# Altium integrated library ICL_komponenty_v1.IntLib: 293 symbols (part 1 of 2) (continued)
## DTSV_SMAJ15A_A001
designator D?, comment SMAJ15A
Single Line TVS Diode  15V 43A; ICLN: DTSV_SMAJ15A_15V_DO214AC_A001
footprint DO214AC
pins: 1 A, 2 K

## DTSV_SMBJ130A_A001
designator D?, comment SMBJ130A
Single Line TVS Diode  130V 600W; ICLN: DTSV_SMBJ130A_130V_DO214AA_A001
footprint DO214AA
pins: 1 A, 2 K

## DTSV_SMCJ60CA_60V_A001
designator D?, comment SMCJ60CA
60V  TVS Diode; ICLN: DTSV_SMCJ60CA_DO214AB_A001
footprint DO-214AB (DO-214AB TSV)
pins: 1 A, 2 K

## DTSV_VCAN16A2-03S_STO23_A001
designator D?, comment VCAN16A2-03S
dual Line TVS Diode  17V; ICLN: DTSV_VCAN16A2-03S_STO23_A001
footprint SOT-23
pins: 1, 2, 3

## DTSVA_2xUni_5V_A001
designator D?, comment RClamp0502
5V Dual Line TVS Diode; ICLN: D_TSVA_2xUNI_5V_SOT323_N001
footprint SOT-523
pins: 1 K, 2 K, 3 CA

## DTSVA_ESDA5V3SC5_A001
designator D?, comment ESDA5V3C5
Quad TSV array 5V3; ITSN: DTSVA_ESDA5V3SC5_5V9_22A_SOT23-6_A001
footprint SOT23-6 (Zetex)
pins: 1, 2, 3, 4, 5, 6

## DTSVA_USBLC6-2_A001
designator D?, comment ESDA5V3C5
Quad TSV array 5V3; ITSN: DTSVA_USBLC6_SOT-26_A001
footprint SOT23-6 (Zetex)
pins: 1, 2, 3, 4, 5, 6

## DW02
designator U?, comment DW02C
Lithium battery protected circuit; ICLN: IC_DW02C_SOT23-6_A001
footprint SOT-23-5
pins: 1 NC, 2 GND, 3 VDD (power), 4 VM (power), 5 VM (power)

## DZ_4V3_MMSZ4687_A001
designator D?, comment 4V3
4V3 Zener Iz=50uA SOD-123; ICLN: DZ_4V3_50uA_SOD123_A001
footprint SOD-123
pins: 1 A, 2 K

## DZ_5V6_SOD323_A001
designator D?, comment 5V6
5V6 2%; ICLN: DZ_5V6_SOD323_A001
footprint SOD-323
pins: 1 A, 2 K

## DZ_6V2_ZMM6V2_A001
designator D?, comment ZMM6V2
6V2 Zener, LL-34 MiniMelf; ICLN: nn
footprint MINIMELF
pins: 1 A, 2 K

## DZ_8V2_BZX585_A001
designator D?, comment BZX585-C8V2
8V2 Zener, SOD-523; ITSN: DZ_8V2_BZX585_SOD-523_A001
footprint SOD-523 (SC-79)
pins: 1 A, 2 K

## DZ_8V2_MMSZ5237_A001
designator D?, comment MMSZ5237
8V2 Zener, SOD-323; ITSN: DZ_8V2_MMSZ5237_SOD323_A001
footprint SOD-323
pins: 1 A, 2 K

## DZ_12V_BZX384-B12_A001
designator D?, comment BZX384-B12
12V Zener Iz=50uA SOD-323; ITSN: DZ_12V_BZX384_SOD323_A001
footprint SOD-323
pins: 1 A, 2 K

## DZ_12V_DMP4051LK3_A001
designator D?, comment DMP4051LK3
12V Zener Iz=250uA SOD-123; ICLN: DZ_12V_MMSZ5242B_SOD-123_A001
footprint SOD-123
pins: 1 A, 2 K

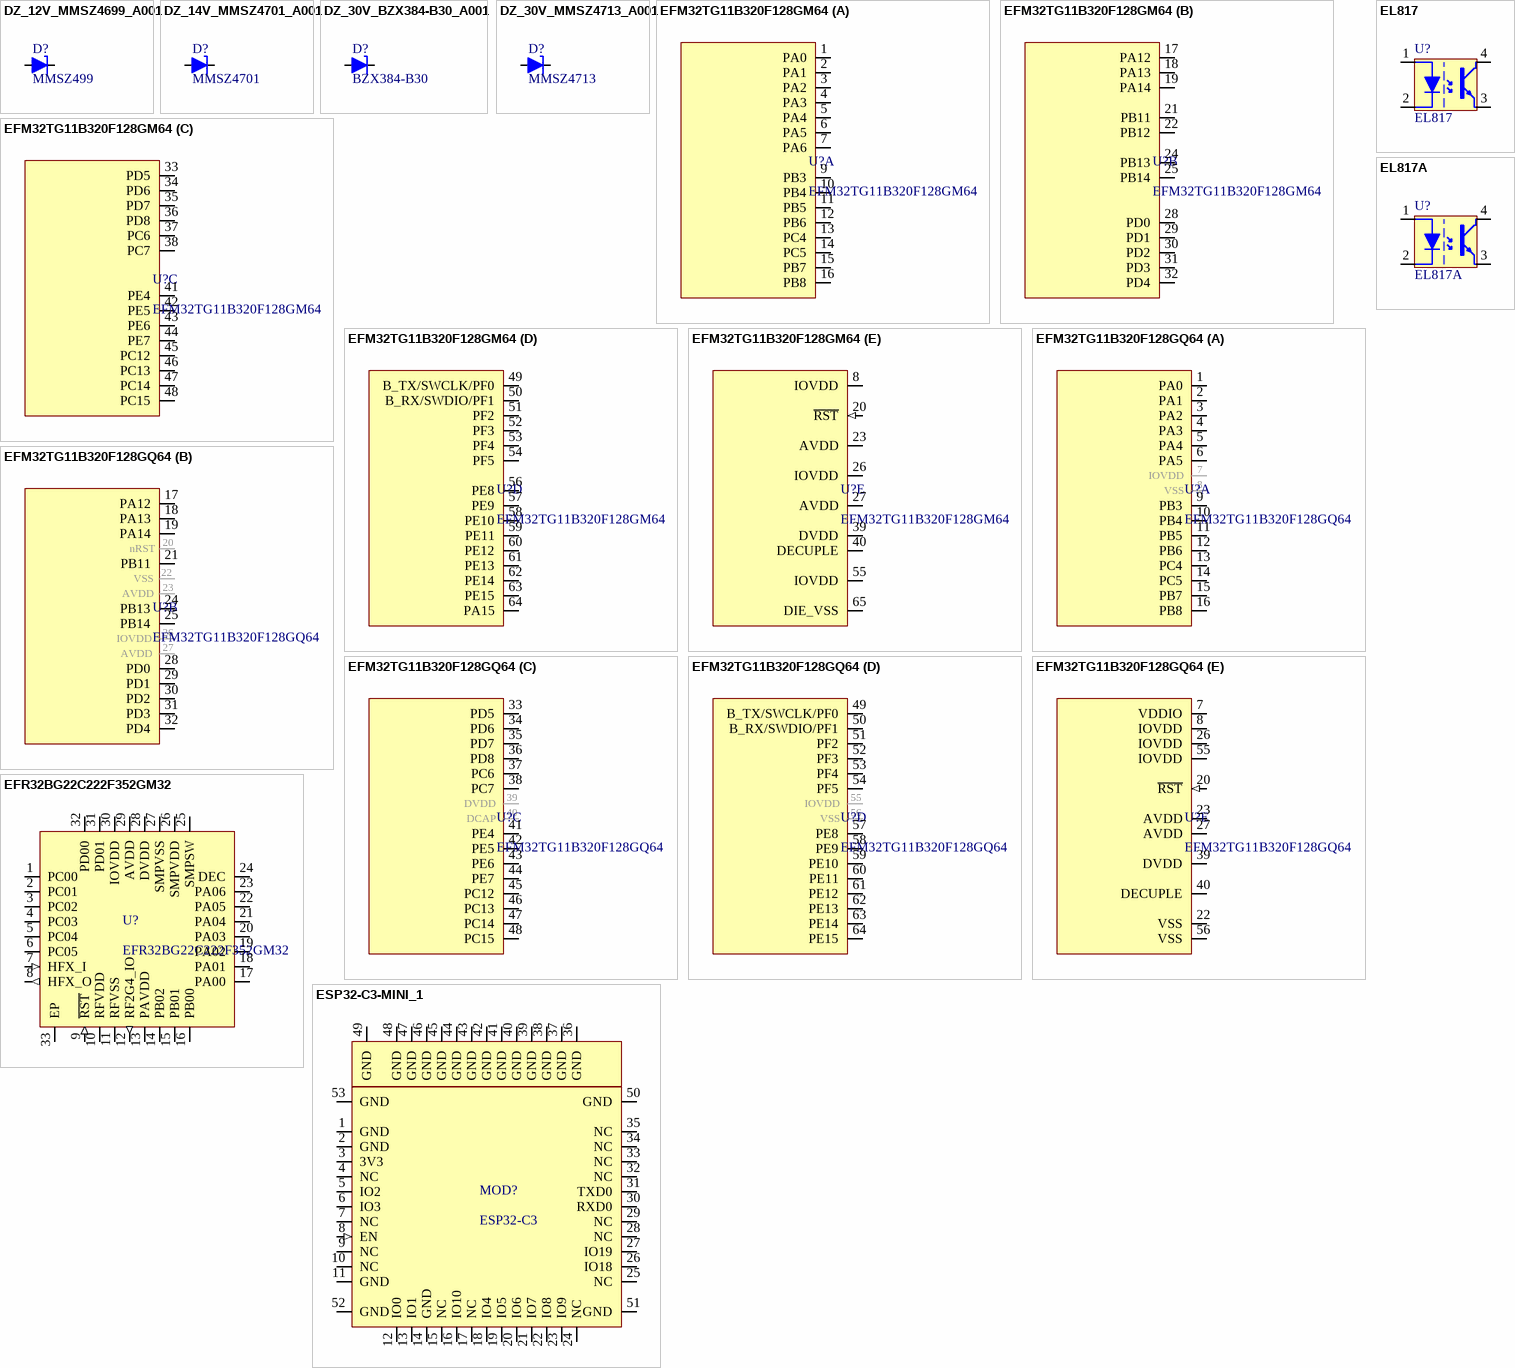
[diagram p4: symbols DZ_12V_MMSZ4699_A001 to ESP32-C3-MINI_1]

## DZ_12V_MMSZ4699_A001
designator D?, comment MMSZ499
12V Zener Iz=50uA SOD-123; ITSN: DZ_12V_MMSZ4699_SOD-123_A001
footprint SOD-123
pins: 1 A, 2 K

## DZ_14V_MMSZ4701_A001
designator D?, comment MMSZ4701
14V Zener Iz=50uA SOD-123; ICLN: DZ_14V_MMSZ4701_SOD-123_A001
footprint SOD-123
pins: 1 A, 2 K

## DZ_30V_BZX384-B30_A001
designator D?, comment BZX384-B30
30V Zener Iz=50uA SOD-323; ITSN: DZ_30V_BZX384_SOD323_A001
footprint SOD-323
pins: 1 A, 2 K

## DZ_30V_MMSZ4713_A001
designator D?, comment MMSZ4713
30V Zener Iz=50uA SOD-123; ITSN: DZ_30V_MMSZ4713_SOD-123_A001
footprint SOD-123
pins: 1 A, 2 K

## EFM32TG11B320F128GM64
designator U?
EFM32TG11 FAMILY: EFM32TG11B3XX; ITSN: IC_EFM32TG11B320_QFN64_A001
footprint QFN64_A001 (GECO SILICON LABS)
part A pins: 1 PA0 (io), 2 PA1 (io), 3 PA2 (io), 4 PA3 (io), 5 PA4 (io), 6 PA5 (io), 7 PA6 (io), 9 PB3 (io), 10 PB4 (io), 11 PB5 (io), 12 PB6 (io), 13 PC4 (io), 14 PC5 (io), 15 PB7 (io), 16 PB8 (io)
part B pins: 17 PA12 (io), 18 PA13 (io), 19 PA14 (io), 21 PB11 (io), 22 PB12 (io), 24 PB13 (io), 25 PB14 (io), 28 PD0 (io), 29 PD1 (io), 30 PD2 (io), 31 PD3 (io), 32 PD4 (io)
part C pins: 33 PD5 (io), 34 PD6 (io), 35 PD7 (io), 36 PD8 (io), 37 PC6 (io), 38 PC7 (io), 41 PE4 (io), 42 PE5 (io), 43 PE6 (io), 44 PE7 (io), 45 PC12 (io), 46 PC13 (io), 47 PC14 (io), 48 PC15 (io)
part D pins: 49 B_TX/SWCLK/PF0 (io), 50 B_RX/SWDIO/PF1 (io), 51 PF2 (io), 52 PF3 (io), 53 PF4 (io), 54 PF5 (io), 56 PE8 (io), 57 PE9 (io), 58 PE10 (io), 59 PE11 (io), 60 PE12 (io), 61 PE13 (io), 62 PE14 (io), 63 PE15 (io), 64 PA15 (io)
part E pins: 8 IOVDD (power), 20 ~{RST} (in), 23 AVDD (power), 26 IOVDD (power), 27 AVDD (power), 39 DVDD (power), 40 DECUPLE, 55 IOVDD (power), 65 DIE_VSS

## EFM32TG11B320F128GQ64
designator U?
EFM32TG11 FAMILY: EFM32TG11B3XX LQFP64; ITSN: IC_EFM32TG11B320_QFP64_A001
footprint LQFP64_small (TSQFP, 64-Leads, Body 10,00x10,00mm, Pitch 0,50mm)
part A pins: 1 PA0 (io), 2 PA1 (io), 3 PA2 (io), 4 PA3 (io), 5 PA4 (io), 6 PA5 (io), 9 PB3 (io), 10 PB4 (io), 11 PB5 (io), 12 PB6 (io), 13 PC4 (io), 14 PC5 (io), 15 PB7 (io), 16 PB8 (io)
part B pins: 17 PA12 (io), 18 PA13 (io), 19 PA14 (io), 21 PB11 (io), 24 PB13 (io), 25 PB14 (io), 28 PD0 (io), 29 PD1 (io), 30 PD2 (io), 31 PD3 (io), 32 PD4 (io)
part C pins: 33 PD5 (io), 34 PD6 (io), 35 PD7 (io), 36 PD8 (io), 37 PC6 (io), 38 PC7 (io), 41 PE4 (io), 42 PE5 (io), 43 PE6 (io), 44 PE7 (io), 45 PC12 (io), 46 PC13 (io), 47 PC14 (io), 48 PC15 (io)
part D pins: 49 B_TX/SWCLK/PF0 (io), 50 B_RX/SWDIO/PF1 (io), 51 PF2 (io), 52 PF3 (io), 53 PF4 (io), 54 PF5 (io), 57 PE8 (io), 58 PE9 (io), 59 PE10 (io), 60 PE11 (io), 61 PE12 (io), 62 PE13 (io), 63 PE14 (io), 64 PE15 (io)
part E pins: 7 VDDIO (power), 8 IOVDD (power), 20 ~{RST} (in), 22 VSS (power), 23 AVDD (power), 26 IOVDD (power), 27 AVDD (power), 39 DVDD (power), 40 DECUPLE, 55 IOVDD (power), 56 VSS (power)
part B text: nRST
part C text: DCAP

## EFR32BG22C222F352GM32
designator U?
EFR32BG22 Wireless Gecko SoC 32Kram 352Kflash; ICLN: IC_EFR32BG22C222F352_QFN32_A01
footprint QFN32_EFM32 (Silicon Labs)
pins: 1 PC00 (io), 2 PC01 (io), 3 PC02 (io), 4 PC03 (io), 5 PC04 (io), 6 PC05 (io), 7 HFX_I (in), 8 HFX_O (out), 9 ~{RST} (in), 10 RFVDD (power), 11 RFVSS (power), 12 RF2G4_IO (out), 13 PAVDD (power), 14 PB02 (io), 15 PB01 (io), 16 PB00 (io), 17 PA00 (io), 18 PA01 (io), 19 PA02 (io), 20 PA03 (io), 21 PA04 (io), 22 PA05 (io), 23 PA06 (io), 24 DEC, 25 SMPSW, 26 SMPVDD, 27 SMPVSS, 28 DVDD (power), 29 AVDD (power), 30 IOVDD (power), 31 PD01 (io), 32 PD00 (io), 33 EP

## EL817
designator U?
EL817 50%; ICLN: OCT_EL817_SMD_A001
footprint Mini-Flat_4_10mm (10mm version)
pins: 1 A, 2 K, 3 E, 4 C

## EL817A
designator U?
EL817 60-160%; ICLN: OCT_EL817A_SMD_A002
footprint Mini-Flat_4_10mm (10mm version)
pins: 1 A, 2 K, 3 E, 4 C

## ESP32-C3-MINI_1
designator MOD?, comment ESP32-C3
ICLN: MOD_ESP32_C3_MINI_1_A001
footprint ESP32_C3_MINI_1
pins: 1 GND (power), 2 GND (power), 3 3V3 (power), 4 NC, 5 IO2 (io), 6 IO3 (io), 7 NC, 8 EN (in), 9 NC, 10 NC, 11 GND (power), 12 IO0 (io), 13 IO1 (io), 14 GND (power), 15 NC, 16 IO10 (io), 17 NC, 18 IO4 (io), 19 IO5 (io), 20 IO6 (io), 21 IO7 (io), 22 IO8 (io), 23 IO9 (io), 24 NC, 25 NC, 26 IO18 (io), 27 IO19 (io), 28 NC, 29 NC, 30 RXD0 (io), 31 TXD0 (io), 32 NC, 33 NC, 34 NC, 35 NC, 36 GND (power), 37 GND (power), 38 GND (power), 39 GND (power), 40 GND (power), 41 GND (power), 42 GND (power), 43 GND (power), 44 GND (power), 45 GND (power), 46 GND (power), 47 GND (power), 48 GND (power), 49 GND (power), 50 GND (power), 51 GND (power), 52 GND (power), 53 GND (power)

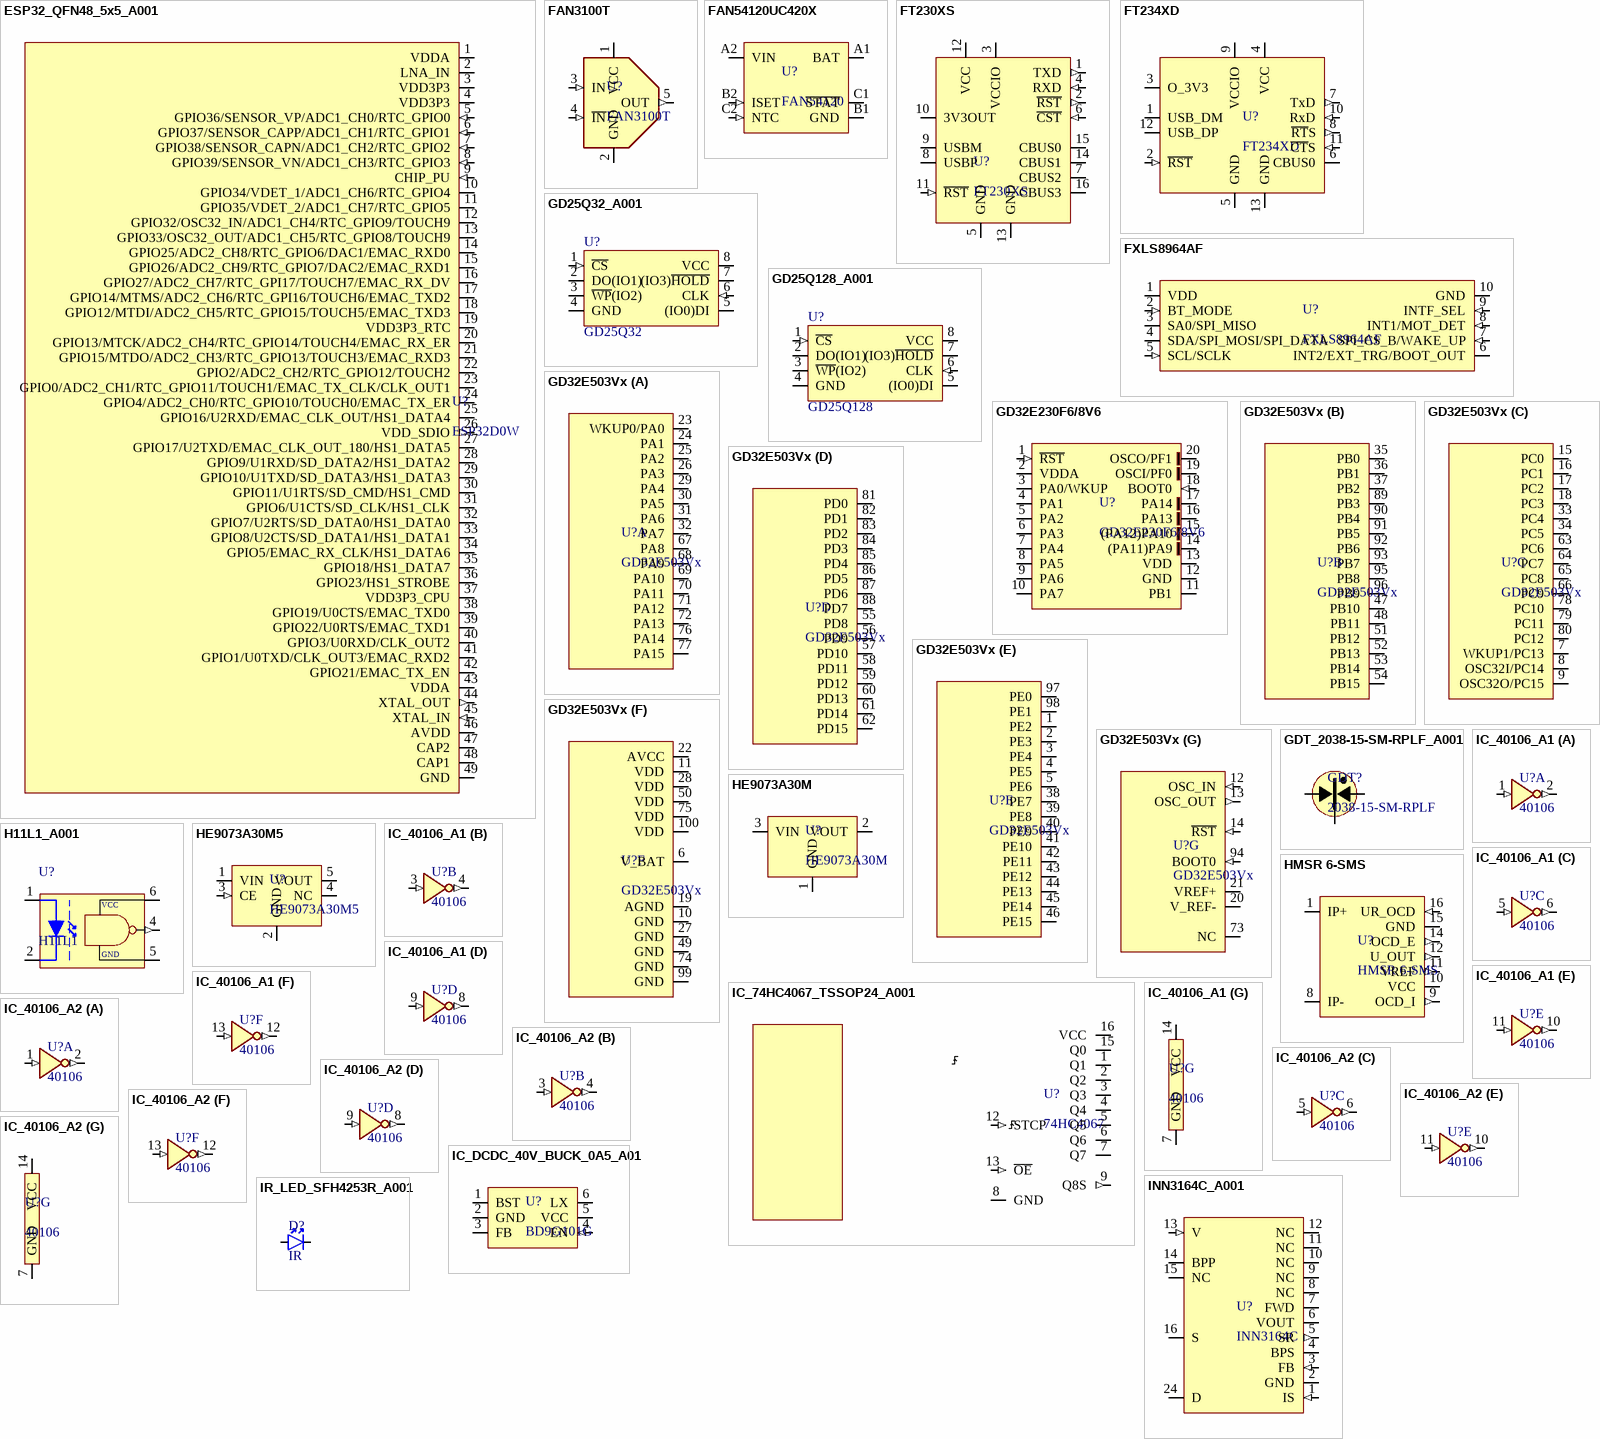
[diagram p5: symbols ESP32_QFN48_5x5_A001 to IR_LED_SFH4253R_A001]

## ESP32_QFN48_5x5_A001
designator U?, comment ESP32D0W
ESP32 QFN48 5x5; ITSN: IC_ESP32D0W_QFN48_A001
footprint QFN48_5_5_v1 (QFN48 5x5)
pins: 1 VDDA (power), 2 LNA_IN, 3 VDD3P3 (power), 4 VDD3P3 (power), 5 GPIO36/SENSOR_VP/ADC1_CH0/RTC_GPIO0 (in), 6 GPIO37/SENSOR_CAPP/ADC1_CH1/RTC_GPIO1 (in), 7 GPIO38/SENSOR_CAPN/ADC1_CH2/RTC_GPIO2 (in), 8 GPIO39/SENSOR_VN/ADC1_CH3/RTC_GPIO3 (in), 9 CHIP_PU (in), 10 GPIO34/VDET_1/ADC1_CH6/RTC_GPIO4 (io), 11 GPIO35/VDET_2/ADC1_CH7/RTC_GPIO5 (io), 12 GPIO32/OSC32_IN/ADC1_CH4/RTC_GPIO9/TOUCH9 (io), 13 GPIO33/OSC32_OUT/ADC1_CH5/RTC_GPIO8/TOUCH9 (io), 14 GPIO25/ADC2_CH8/RTC_GPIO6/DAC1/EMAC_RXD0 (io), 15 GPIO26/ADC2_CH9/RTC_GPIO7/DAC2/EMAC_RXD1 (io), 16 GPIO27/ADC2_CH7/RTC_GPI17/TOUCH7/EMAC_RX_DV (io), 17 GPIO14/MTMS/ADC2_CH6/RTC_GPI16/TOUCH6/EMAC_TXD2 (io), 18 GPIO12/MTDI/ADC2_CH5/RTC_GPIO15/TOUCH5/EMAC_TXD3 (io), 19 VDD3P3_RTC (power), 20 GPIO13/MTCK/ADC2_CH4/RTC_GPIO14/TOUCH4/EMAC_RX_ER (io), 21 GPIO15/MTDO/ADC2_CH3/RTC_GPIO13/TOUCH3/EMAC_RXD3 (io), 22 GPIO2/ADC2_CH2/RTC_GPIO12/TOUCH2 (io), 23 GPIO0/ADC2_CH1/RTC_GPIO11/TOUCH1/EMAC_TX_CLK/CLK_OUT1 (io), 24 GPIO4/ADC2_CH0/RTC_GPIO10/TOUCH0/EMAC_TX_ER (io), 25 GPIO16/U2RXD/EMAC_CLK_OUT/HS1_DATA4 (io), 26 VDD_SDIO (out) "OUTPUT 1V8 OR VDD3P3_RTC", 27 GPIO17/U2TXD/EMAC_CLK_OUT_180/HS1_DATA5 (io), 28 GPIO9/U1RXD/SD_DATA2/HS1_DATA2 (io), 29 GPIO10/U1TXD/SD_DATA3/HS1_DATA3 (io), 30 GPIO11/U1RTS/SD_CMD/HS1_CMD (io), 31 GPIO6/U1CTS/SD_CLK/HS1_CLK (io), 32 GPIO7/U2RTS/SD_DATA0/HS1_DATA0 (io), 33 GPIO8/U2CTS/SD_DATA1/HS1_DATA1 (io), 34 GPIO5/EMAC_RX_CLK/HS1_DATA6 (io), 35 GPIO18/HS1_DATA7 (io), 36 GPIO23/HS1_STROBE (io), 37 VDD3P3_CPU (power), 38 GPIO19/U0CTS/EMAC_TXD0 (io), 39 GPIO22/U0RTS/EMAC_TXD1 (io), 40 GPIO3/U0RXD/CLK_OUT2 (io), 41 GPIO1/U0TXD/CLK_OUT3/EMAC_RXD2 (io), 42 GPIO21/EMAC_TX_EN (io), 43 VDDA (power), 44 XTAL_OUT (out), 45 XTAL_IN (in), 46 AVDD (power), 47 CAP2, 48 CAP1, 49 GND

## FAN3100T
designator U?
2A low side gate driver, dual input
footprint SOT-23-5
pins: 1 VCC (power), 2 GND (power), 3 IN (in), 4 ~{IN} (in), 5 OUT (out)

## FAN54120UC420X
designator U?, comment FAN54120
500 mA USB Compatible Single Cell Li-Lon Linear Charger; ICLN: IC_FAN54120UC420X_BGA_A01
footprint DSBGA-6
pins: A1 BAT (power), A2 VIN (power), B1 GND (power), B2 ISET (in), C1 ~{STAT} (oc), C2 NTC (in)

## FT230XS
designator U?
ITSN: IC_FT230XS_SSOP16_A001
footprint SSOP-16_v2 (smoller)
pins: 1 TXD (out), 2 ~{RST} (out), 3 VCCIO (power), 4 RXD (in), 5 GND (power), 6 ~{CST} (in), 7 CBUS2 (io), 8 USBP, 9 USBM, 10 3V3OUT (power), 11 ~{RST} (in), 12 VCC (power), 13 GND (power), 14 CBUS1 (io), 15 CBUS0 (io), 16 CBUS3 (io)

## FT234XD
designator U?
FTDI FT234XD USART bridge; ITSN: IC_FT234XD_DFN-12_A001
footprint DFN-12 (FTDI DFN-12)
pins: 1 USB_DM, 2 ~{RST} (in), 3 O_3V3 (power), 4 VCC (power), 5 GND (power), 6 CBUS0 (io), 7 TxD (out), 8 ~{RT}S (out), 9 VCCIO (power), 10 RxD (in), 11 ~{CT}S (in), 12 USB_DP, 13 GND (power)

## FXLS8964AF
designator U?
NXP acc low power; ITSN: nn
footprint DFN-10_ACC (PQFN, 10-Leads, Body 2,00x2,00mm, Pitch 0,40mm, Thermal Pad 0,50x0,50mm, IPC Medium Density)
pins: 1 VDD (power), 2 BT_MODE (in), 3 SA0/SPI_MISO (io), 4 SDA/SPI_MOSI/SPI_DATA (io), 5 SCL/SCLK (in), 6 INT2/EXT_TRG/BOOT_OUT (io), 7 SPI_CS_B/WAKE_UP (in), 8 INT1/MOT_DET (in), 9 INTF_SEL (in), 10 GND (power)

## GD25Q32_A001
designator U?, comment GD25Q32
SPI flash; ITSN: IC_GD25Q32_SO8_A001
footprint SOIC-8_208 _150 (150 - 208mm soic 8 package FLASH)
pins: 1 ~{CS} (in), 2 DO(IO1) (io), 3 ~{WP}(IO2) (io), 4 GND (power), 5 (IO0)DI (io), 6 CLK (in), 7 (IO3)~{HOLD} (io), 8 VCC (power)

## GD25Q128_A001
designator U?, comment GD25Q128
SPI/QSPI flash 128Mb; ICLN: IC_GD25Q128_SO8_A001
footprint SOIC-8_208 _150 (150 - 208mm soic 8 package FLASH)
pins: 1 ~{CS} (in), 2 DO(IO1) (io), 3 ~{WP}(IO2) (io), 4 GND (power), 5 (IO0)DI (io), 6 CLK (in), 7 (IO3)~{HOLD} (io), 8 VCC (power)

## GD32E230F6/8V6
designator U?
M23 32-64kB flash 6-8 kB Ram 20 pins LGA20; ICLN: IC_GD32E230F6/8V6_LGA20_A001
footprint LGA-20-GD (GigaDevice LGA20)
pins: 1 ~{RST} (in), 2 VDDA (power), 3 PA0/WKUP (io), 4 PA1 (io), 5 PA2 (io), 6 PA3 (io), 7 PA4 (io), 8 PA5 (io), 9 PA6 (io), 10 PA7 (io), 11 PB1 (io), 12 GND (power), 13 VDD (power), 14 (PA11)PA9 (io), 15 (PA12)PA10 (io), 16 PA13 (io), 17 PA14 (io), 18 BOOT0 (in), 19 OSCI/PF0 (io), 20 OSCO/PF1 (io)

## GD32E503Vx
designator U?
footprint LQFP100_A001 (TSQFP, 100-Leads, Body 14,00x14,00mm, Pitch 0,50mm, IPC Low Density)
part A pins: 23 WKUP0/PA0 (io), 24 PA1 (io), 25 PA2 (io), 26 PA3 (io), 29 PA4 (io), 30 PA5 (io), 31 PA6 (io), 32 PA7 (io), 67 PA8 (io), 68 PA9 (io), 69 PA10 (io), 70 PA11 (io), 71 PA12 (io), 72 PA13 (io), 76 PA14 (io), 77 PA15 (io)
part B pins: 35 PB0 (io), 36 PB1 (io), 37 PB2 (io), 47 PB10 (io), 48 PB11 (io), 51 PB12 (io), 52 PB13 (io), 53 PB14 (io), 54 PB15 (io), 89 PB3 (io), 90 PB4 (io), 91 PB5 (io), 92 PB6 (io), 93 PB7 (io), 95 PB8 (io), 96 PB9 (io)
part C pins: 7 WKUP1/PC13 (io), 8 OSC32I/PC14 (io), 9 OSC32O/PC15 (io), 15 PC0 (io), 16 PC1 (io), 17 PC2 (io), 18 PC3 (io), 33 PC4 (io), 34 PC5 (io), 63 PC6 (io), 64 PC7 (io), 65 PC8 (io), 66 PC9 (io), 78 PC10 (io), 79 PC11 (io), 80 PC12 (io)
part D pins: 55 PD8 (io), 56 PD9 (io), 57 PD10 (io), 58 PD11 (io), 59 PD12 (io), 60 PD13 (io), 61 PD14 (io), 62 PD15 (io), 81 PD0 (io), 82 PD1 (io), 83 PD2 (io), 84 PD3 (io), 85 PD4 (io), 86 PD5 (io), 87 PD6 (io), 88 PD7 (io)
part E pins: 1 PE2 (io), 2 PE3 (io), 3 PE4 (io), 4 PE5 (io), 5 PE6 (io), 38 PE7 (io), 39 PE8 (io), 40 PE9 (io), 41 PE10 (io), 42 PE11 (io), 43 PE12 (io), 44 PE13 (io), 45 PE14 (io), 46 PE15 (io), 97 PE0 (io), 98 PE1 (io)
part F pins: 6 V_BAT (power), 10 GND (power), 11 VDD (power), 19 AGND (power), 22 AVCC (power), 27 GND (power), 28 VDD (power), 49 GND (power), 50 VDD (power), 74 GND (power), 75 VDD (power), 99 GND (power), 100 VDD (power)
part G pins: 12 OSC_IN (in), 13 OSC_OUT (out), 14 ~{RST} (in), 20 V_REF- (power), 21 VREF+ (power), 73 NC, 94 BOOT0 (in)

## GDT_2038-15-SM-RPLF_A001
designator GDT?, comment 2038-15-SM-RPLF
3-Electrode Surface Mount Gas Discharge Tube; ICLN: GDT_2038-15-SM_A001
footprint 2038-15-SM-RPLF (GDT  BOURNS)
pins: 1 E1, 2 EC, 3 E2

## H11L1_A001
designator U?, comment H11L1
Digital output transoptor - multi package; ICLN: OCD_MULTI_SMD_A002
footprint SDIP6_SPECIAL_1 (multi transoptor footprint)
pins: 1 A, 2 K, 4 GND (out), 5 OUT, 6 VCC

## HE9073A30M
designator U?
0u3A IQ LDO 3V0; ICLN: IC_HE9073A30M_SOT23_A001
footprint SOT-23
pins: 1 GND (power), 2 VOUT (power), 3 VIN (power)

## HE9073A30M5
designator U?
0u3A IQ LDO 3V0; ICLN: IC_HE9073A30M5_SOT23-5_A001
footprint SOT-23-5
pins: 1 VIN (power), 2 GND (power), 3 CE (in), 4 NC (power), 5 VOUT (power)

## HMSR 6-SMS
designator U?
hall CS 6A; ICLN: IC_HMSR 6-SMS_SMD_A001
footprint HMSR-XX-SMS (LEM CS)
pins: 1 IP+, 8 IP-, 9 OCD_I (out), 10 VCC (power), 11 VREF (out), 12 U_OUT (out), 14 OCD_E (out), 15 GND (power), 16 UR_OCD (in)

## IC_74HC4067_TSSOP24_A001
designator U?, comment 74HC4067
1:16 analog multiplekser; ICLN: IC_74HC4067_TSSOP24_A001
pins: 1 Q1 (oc), 2 Q2 (oc), 3 Q3 (oc), 4 Q4 (oc), 5 Q5 (oc), 6 Q6 (oc), 7 Q7 (oc), 8 GND (power), 9 Q8S (out), 12 STCP (in), 13 ~{OE} (in), 15 Q0 (oc), 16 VCC (power)

## IC_40106_A1
designator U?, comment 40106
6 x inverter SO14; ICLN: IC_40106_SO-14_A001
footprint SO-14
part A pins: 1 A1 (in), 2 ~{Y1} (out)
part B pins: 3 A2 (in), 4 ~{Y2} (out)
part C pins: 5 A3 (in), 6 ~{Y3} (out)
part D pins: 8 ~{Y4} (out), 9 A4 (in)
part E pins: 10 ~{Y5} (out), 11 A5 (in)
part F pins: 12 ~{Y6} (out), 13 A6 (in)
part G pins: 7 GND (power), 14 VCC (power)

## IC_40106_A2
designator U?, comment 40106
6 x inverter SO14; ICLN: IC_40106_SO-14_A001
footprint TSSOP-14
part A pins: 1 A1 (in), 2 ~{Y1} (out)
part B pins: 3 A2 (in), 4 ~{Y2} (out)
part C pins: 5 A3 (in), 6 ~{Y3} (out)
part D pins: 8 ~{Y4} (out), 9 A4 (in)
part E pins: 10 ~{Y5} (out), 11 A5 (in)
part F pins: 12 ~{Y6} (out), 13 A6 (in)
part G pins: 7 GND (power), 14 VCC (power)

## IC_DCDC_40V_BUCK_0A5_A01
designator U?, comment BD9G101G
40V buck 0.5A converter.; ICLN: IC_DCDC_40V_BUCK_0A5_SOT23-6_A001
footprint SOT23-6 (Zetex)
pins: 1 BST, 2 GND (power), 3 FB, 4 EN (in), 5 VCC (power), 6 LX

## INN3164C_A001
designator U?, comment INN3164C
ICLN: IC_INN3164C_SMD_A001
footprint InSOP-24D (Power Integration)
pins: 1 IS (in), 2 GND (power), 3 FB (in), 4 BPS, 5 SR (out), 6 VOUT, 7 FWD, 8 NC, 9 NC, 10 NC, 11 NC, 12 NC, 13 V (in), 14 BPP, 15 NC, 16 S, 24 D

## IR_LED_SFH4253R_A001
designator D?, comment IR
LED IR PLCC reverse mounting; ITSN: nn
footprint PLCC_RG_v2 (reverse mounting PLCC IR)
pins: 1 A, 2 K

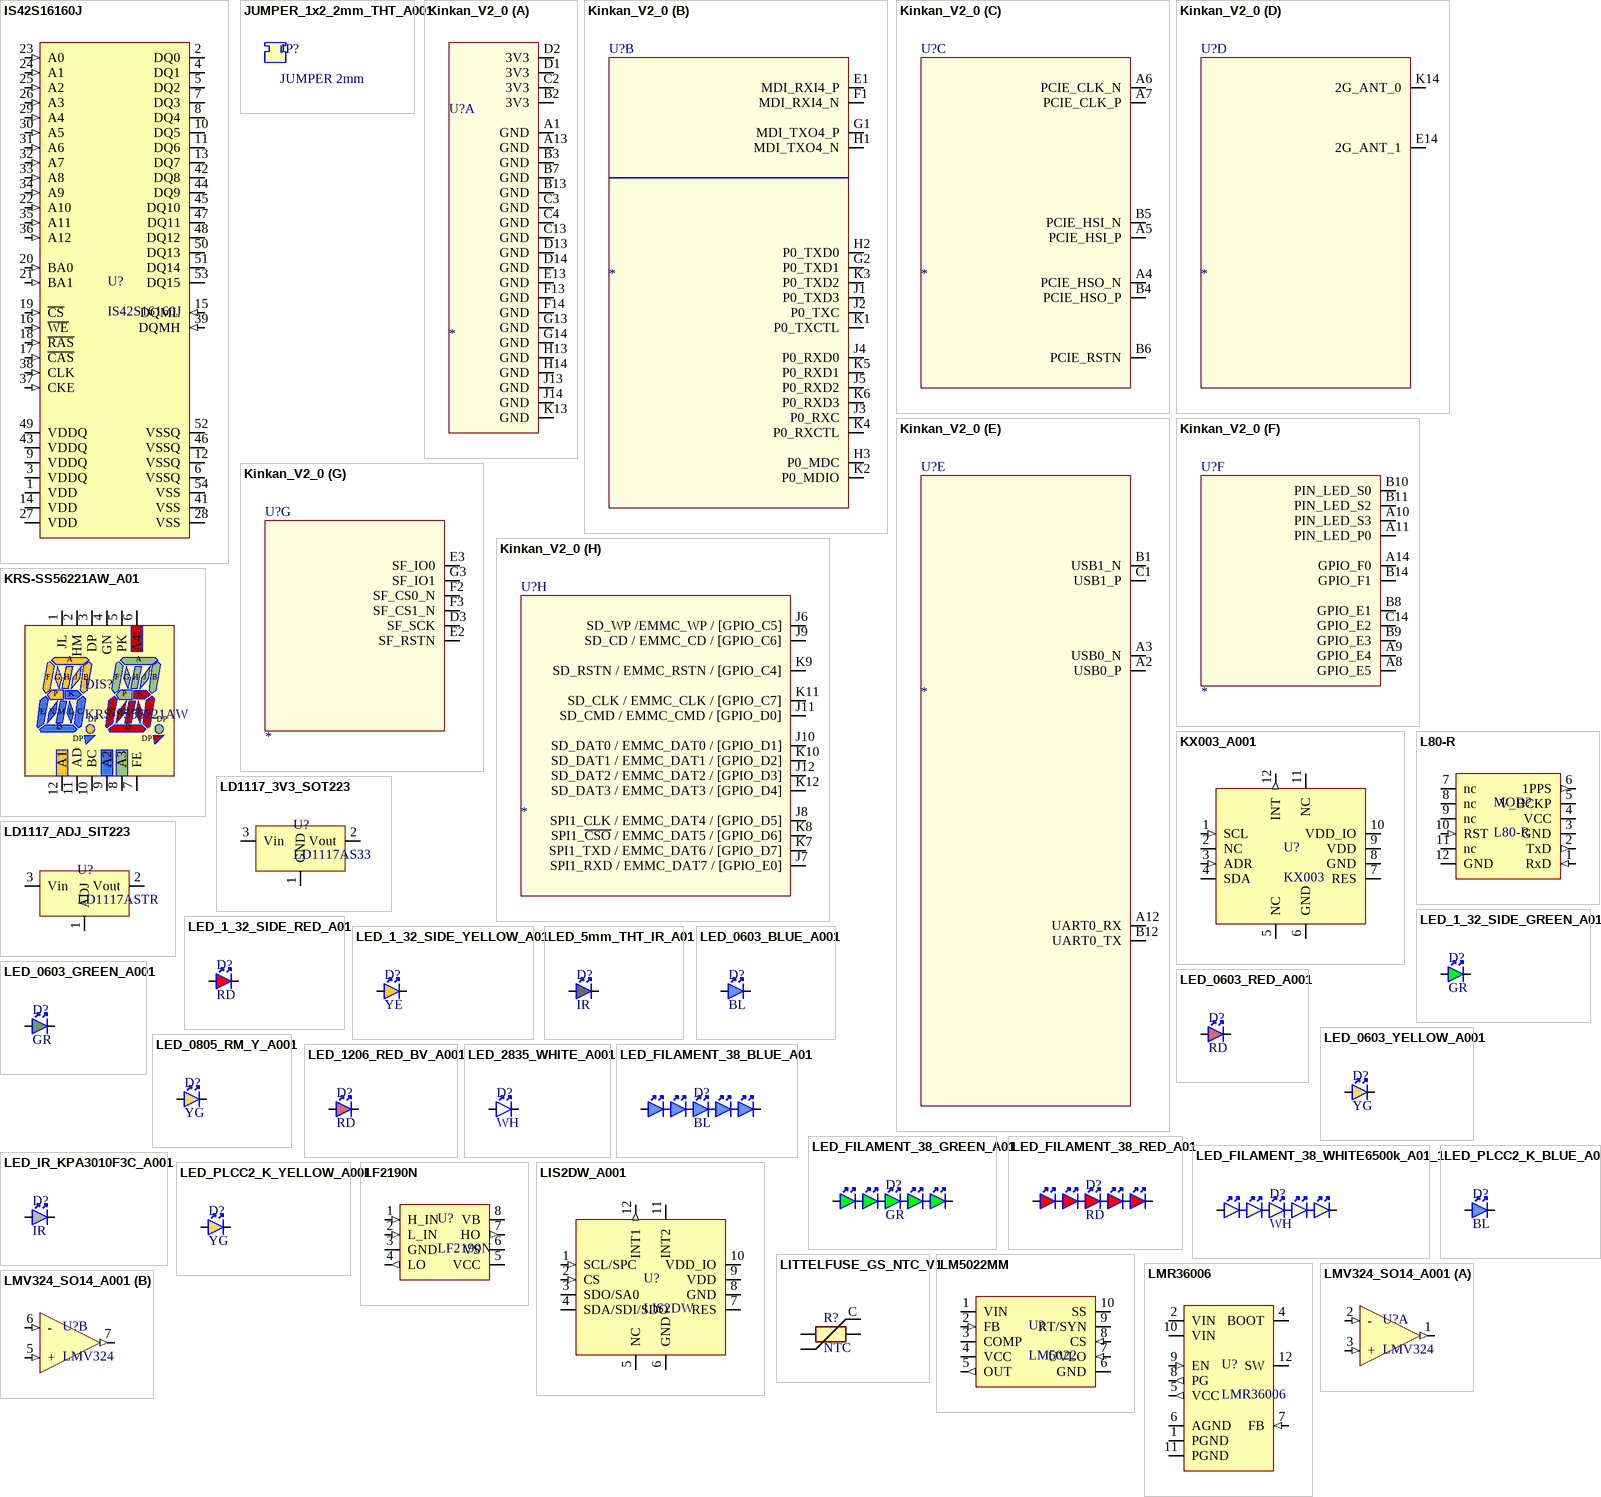
[diagram p6: symbols IS42S16160J to LMV324_SO14_A001]

## IS42S16160J
designator U?
SDRAM TSOP 54 standard
footprint TSOP-54 (TSOP, 54-Leads, Body 22,22x10,16mm, Pitch 0,80mm, IPC Medium Density)
pins: 1 VDD (power), 2 DQ0 (io), 3 VDDQ (power), 4 DQ1 (io), 5 DQ2 (io), 6 VSSQ (power), 7 DQ3 (io), 8 DQ4 (io), 9 VDDQ (power), 10 DQ5 (io), 11 DQ6 (io), 12 VSSQ (power), 13 DQ7 (io), 14 VDD (power), 15 DQML (in), 16 ~{WE} (in), 17 ~{CAS} (in), 18 ~{RAS} (in), 19 ~{CS} (in), 20 BA0 (in), 21 BA1 (in), 22 A10 (in), 23 A0 (in), 24 A1 (in), 25 A2 (in), 26 A3 (in), 27 VDD (power), 28 VSS (power), 29 A4 (in), 30 A5 (in), 31 A6 (in), 32 A7 (in), 33 A8 (in), 34 A9 (in), 35 A11 (in), 36 A12 (in), 37 CKE (in), 38 CLK (in), 39 DQMH (in), 41 VSS (power), 42 DQ8 (io), 43 VDDQ (power), 44 DQ9 (io), 45 DQ10 (io), 46 VSSQ (power), 47 DQ11 (io), 48 DQ12 (io), 49 VDDQ (power), 50 DQ13 (io), 51 DQ14 (io), 52 VSSQ (power), 53 DQ15 (io), 54 VSS (power)

## JUMPER_1x2_2mm_THT_A001
designator JP?, comment JUMPER 2mm
footprint JUMPER_2_A001

## Kinkan_V2_0
designator U?
ICLN: MOD_KINKAN_V2_A001
footprint Kinkan_V2.0 (Footprint not found)
part A pins: A1 GND, A13 GND, B2 3V3, B3 GND, B7 GND, B13 GND, C2 3V3, C3 GND, C4 GND, C13 GND, D1 3V3, D2 3V3, D13 GND, D14 GND, E13 GND, F13 GND, F14 GND, G13 GND, G14 GND, H13 GND, H14 GND, J13 GND, J14 GND, K13 GND
part B pins: E1 MDI_RXI4_P, F1 MDI_RXI4_N, G1 MDI_TXO4_P, G2 P0_TXD1, H1 MDI_TXO4_N, H2 P0_TXD0, H3 P0_MDC, J1 P0_TXD3, J2 P0_TXC, J3 P0_RXC, J4 P0_RXD0, J5 P0_RXD2, K1 P0_TXCTL, K2 P0_MDIO, K3 P0_TXD2, K4 P0_RXCTL, K5 P0_RXD1, K6 P0_RXD3
part C pins: A4 PCIE_HSO_N, A5 PCIE_HSI_P, A6 PCIE_CLK_N, A7 PCIE_CLK_P, B4 PCIE_HSO_P, B5 PCIE_HSI_N, B6 PCIE_RSTN
part D pins: E14 2G_ANT_1, K14 2G_ANT_0
part E pins: A2 USB0_P, A3 USB0_N, A12 UART0_RX, B1 USB1_N, B12 UART0_TX, C1 USB1_P
part F pins: A8 GPIO_E5, A9 GPIO_E4, A10 PIN_LED_S3, A11 PIN_LED_P0, A14 GPIO_F0, B8 GPIO_E1, B9 GPIO_E3, B10 PIN_LED_S0, B11 PIN_LED_S2, B14 GPIO_F1, C14 GPIO_E2
part G pins: D3 SF_SCK, E2 SF_RSTN, E3 SF_IO0, F2 SF_CS0_N, F3 SF_CS1_N, G3 SF_IO1
part H pins: J6 SD_WP /EMMC_WP / [GPIO_C5], J7 SPI1_RXD / EMMC_DAT7 / [GPIO_E0], J8 SPI1_CLK / EMMC_DAT4 / [GPIO_D5], J9 SD_CD / EMMC_CD / [GPIO_C6], J10 SD_DAT0 / EMMC_DAT0 / [GPIO_D1], J11 SD_CMD / EMMC_CMD / [GPIO_D0], J12 SD_DAT2 / EMMC_DAT2 / [GPIO_D3], K7 SPI1_TXD / EMMC_DAT6 / [GPIO_D7], K8 SPI1_~{CSO} / EMMC_DAT5 / [GPIO_D6], K9 SD_RSTN / EMMC_RSTN / [GPIO_C4], K10 SD_DAT1 / EMMC_DAT1 / [GPIO_D2], K11 SD_CLK / EMMC_CLK / [GPIO_C7], K12 SD_DAT3 / EMMC_DAT3 / [GPIO_D4]

## KRS-SS56221AW_A01
designator DIS?, comment KRS-SS56221AW
14+2 segment LED display SMD; ICLN: DISP_LED_14+2_SEG_CUST__SMD_A001
footprint KRS-SS56221AW (led display 16 segment)
pins: 1 JL, 2 HM, 3 DP, 4 GN, 5 PK, 6 A4, 7 FE, 8 A3, 9 A2, 10 BC, 11 AD, 12 A1
text: A; F; G; H; J; B; P; K; E; N; M; L; C; D

## KX003_A001
designator U?, comment KX003
KX003-1077; ITSN: IC_KX003_LGA12_A001
footprint LGA-12_ACC (LGA, 12-Leads, Body 2,00x2,00mmx0,70mm, Pitch 0,50mm)
pins: 1 SCL (in), 2 NC, 3 ADR (in), 4 SDA (io), 5 NC, 6 GND (power), 7 RES, 8 GND (power), 9 VDD (power), 10 VDD_IO (power), 11 NC, 12 INT (out)

## L80-R
designator MOD?
ITSN: MOD_GPS_L80_A001
footprint L80-R
pins: 1 RxD (in), 2 TxD (out), 3 GND (power), 4 VCC (power), 5 V_BCKP (power), 6 1PPS (out), 7 nc, 8 nc, 9 nc, 10 RST (in), 11 nc, 12 GND (power)

## LD1117_3V3_SOT223
designator U?, comment LD1117AS33
3V3 LD1117 SOT223; ICLN: IC_LD1117_3V3_SOT223_A001
footprint SOT-223
pins: 1 GND, 2 Vout, 3 Vin

## LD1117_ADJ_SIT223
designator U?, comment LD1117ASTR
ADJ LD1117 SOT223; ITSN: IC_LD1117_ADJ_SOT223_A001
footprint SOT-223
pins: 1 ADJ, 2 Vout, 3 Vin

## LED_1_32_SIDE_GREEN_A01
designator D?, comment GR
Side View LED 1x3.2mm Green; ICLN: LED_GR_SIDE_1_32_SMD_A01
footprint LED_1_32_SIDE_GR (1x3.2mm side view green LED)
pins: 1 A, 2 K

## LED_1_32_SIDE_RED_A01
designator D?, comment RD
Side View LED 1x3.2mm Red; ICLN: LED_RD_SIDE_1_32_SMD_A01
footprint LED_1_32_SIDE_RD (1x3.2mm side view red LED)
pins: 1 A, 2 K

## LED_1_32_SIDE_YELLOW_A01
designator D?, comment YE
Side View LED 1x3.2mm Yellow; ICLN: LED_YE_SIDE_1_32_SMD_A01
footprint LED_1_32_SIDE_YE (1x3.2mm side view yelow LED)
pins: 1 A, 2 K

## LED_5mm_THT_IR_A01
designator D?, comment IR
High power IR rtransmitter; ICLN: IRREC_TSSP4P38_THT_A001
footprint 5MM_IR_A001
pins: 1 A, 2 K

## LED_0603_BLUE_A001
designator D?, comment BL
LED 0603 Blue , regular; ITSN: LED_0603_BLUE_A001
footprint 0603_LED_BL (0603 LED Blue)
pins: 1 A, 2 K

## LED_0603_GREEN_A001
designator D?, comment GR
LED 0603 Green , regular; ITSN: LED_0603_GREEN_A001
footprint 0603_LED_GR (0603 LED Green)
pins: 1 A, 2 K

## LED_0603_RED_A001
designator D?, comment RD
LED 0603 Red , regular; ITSN: LED_0603_RED_A001
footprint 0603_LED_RD (0603 LED Red)
pins: 1 A, 2 K

## LED_0603_YELLOW_A001
designator D?, comment YG
LED 0603 Yellow , regular; ITSN: LED_0603_YELLOW_A001
footprint 0603_LED_YE (0603 LED Yellow)
pins: 1 A, 2 K

## LED_0805_RM_Y_A001
designator D?, comment YG
LED 0805 Yellow , reverse mounting; ITSN: LED_0603_YELLOW_A001
footprint 0805_LED_RM_YE (0805 LED Yellow rewerse mount)
pins: 1 A, 2 K

## LED_1206_RED_BV_A001
designator D?, comment RD
LED 0603 Red , regular; ITSN: nn
footprint 1206_LED_BV_RD (1206 LED Red bottom viev)
pins: 1 A, 2 K

## LED_2835_WHITE_A001
designator D?, comment WH
LED 2835 white , bright; ITSN: nn
footprint JE2835xx (cree led)
pins: 1 A, 2 K

## LED_FILAMENT_38_BLUE_A01
designator D?, comment BL
LED filament blue; ICLN: LED_FILAMENT_38_BLUE_A001
footprint LED_filament_38mm_BLUE_A001
pins: 1 A, 2 K

## LED_FILAMENT_38_GREEN_A01
designator D?, comment GR
LED filament green; ICLN: LED_FILAMENT_38_GREEN_A001
footprint LED_filament_38mm_GREEN_A001
pins: 1 A, 2 K

## LED_FILAMENT_38_RED_A01
designator D?, comment RD
LED filament red; ICLN: LED_FILAMENT_38_RED_A001
footprint LED_filament_38mm_RED_A001
pins: 1 A, 2 K

## LED_FILAMENT_38_WHITE6500k_A01_1
designator D?, comment WH
LED filament white 6500k; ICLN: LED_FILAMENT_38_WHITE6500k_A001
footprint LED_filament_38mm_WHITE_A001
pins: 1 A, 2 K

## LED_IR_KPA3010F3C_A001
designator D?, comment IR
LED IR 3x2x1mm Side right KPA3010F3C; ICLN: LED_IR_KPA3010F3C_A001
footprint IR_030201_SIDE_1 (IR emiter side right)
pins: 1 K, 2 A

## LED_PLCC2_K_BLUE_A001
designator D?, comment BL
LED PLCC2 Blue , angle; ICLN: LED_PLCC2_K_BLUE_A001
footprint PLCC2_K_LED_BL (PLCC2 angle Blue)
pins: 1 K, 2 A

## LED_PLCC2_K_YELLOW_A001
designator D?, comment YG
LED PLCC2 Yellow , angle; ICLN: LED_PLCC2_K_YELOW_A001
footprint PLCC2_K_LED_YE (PLCC2 angle yelow)
pins: 1 K, 2 A

## LF2190N
designator U?
High-Side / Low-Side Gate Driver 4.5A/4.5A 600V; ICLN: IC_LF2190N_SO8_A001
footprint SO-8
pins: 1 H_IN (in), 2 L_IN (in), 3 GND (power), 4 LO (out), 5 VCC (power), 6 VS, 7 HO (out), 8 VB (power)

## LIS2DW_A001
designator U?, comment LIS2DW
ITSN: IC_LIS2HH_LGA12_A001
footprint LGA-12 (LGA, 12-Leads, Body 2,00x2,00mmx0,70mm, Pitch 0,50mm)
pins: 1 SCL/SPC (in), 2 CS (in), 3 SDO/SA0 (io), 4 SDA/SDI/SDO (io), 5 NC, 6 GND (power), 7 RES, 8 GND (power), 9 VDD (power), 10 VDD_IO (power), 11 INT2 (io), 12 INT1 (out)

## LITTELFUSE_GS_NTC_V1
designator R?, comment NTC
ITSN: nn
footprint LittelFuse_GS_V_4mm_v 1 (NTC glass drop)
footprint LittelFuse_GS_V_4mm_v2 (NTC glass drop)
pins: 1, 2
text: C

## LM5022MM
designator U?, comment LM5022
boost converter
footprint SSOP-10 (st viper 11 series)
pins: 1 VIN (power), 2 FB (in), 3 COMP, 4 VCC (power), 5 OUT (out), 6 GND (power), 7 UVLO (in), 8 CS (in), 9 RT/SYN, 10 SS

## LMR36006
designator U?
60V 0A6 synchronus step-down converter; ITSN: LMR36006_A001
footprint VQFN-HR-12 (TI VQFN-HR-12)
pins: 1 PGND (power), 2 VIN (power), 4 BOOT, 5 VCC (out), 6 AGND (power), 7 FB (in), 8 PG (out), 9 EN (in), 10 VIN (power), 11 PGND (power), 12 SW

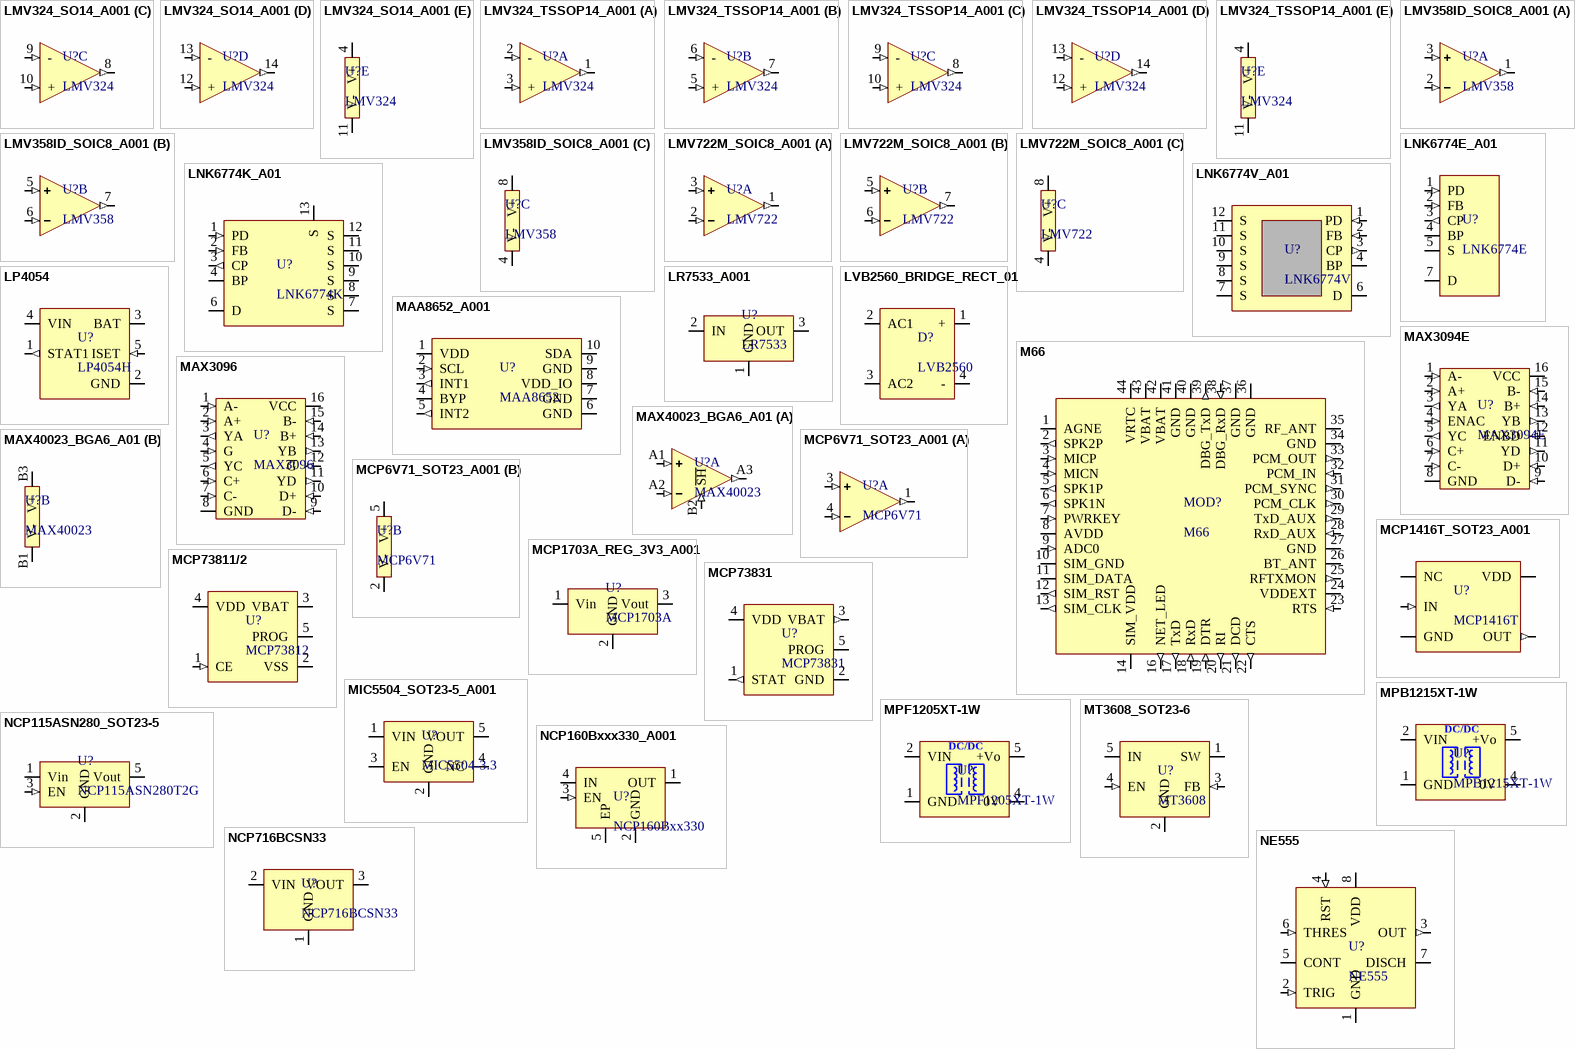
[diagram p7: symbols LMV324_SO14_A001 to NE555]